# Altium integrated library Library 3D.IntLib: 259 symbols
Pins are listed as number, name and electrical type; pins without a type are passive.

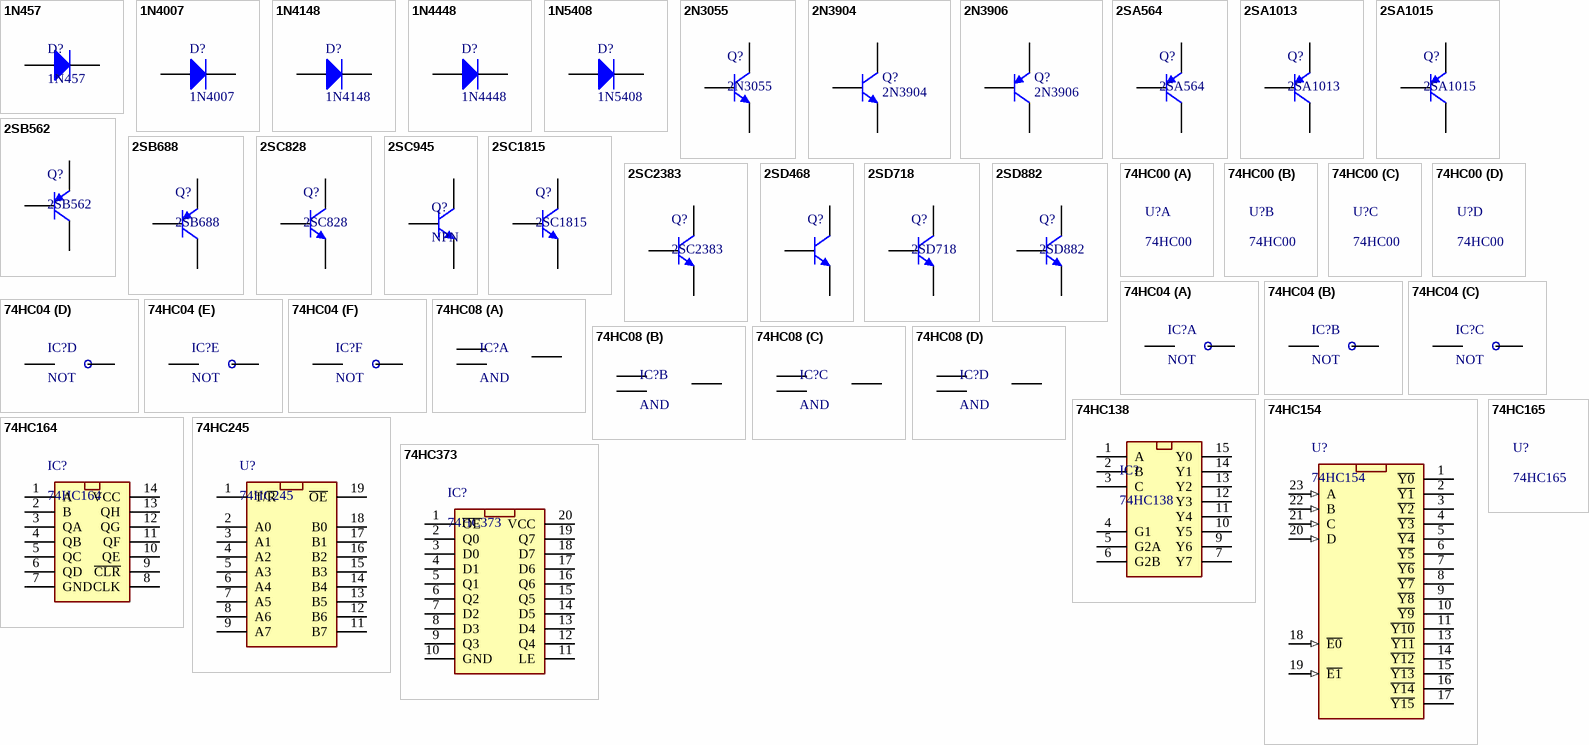
[diagram p0: symbols 1N457 to 74HC373]

## 1N457
designator D?
footprint DO 35
pins: 1 A, 2 K

## 1N4007
designator D?
Published: 8-Jun-2000; LatestRevisionDate: 17-Jul-2002; LatestRevisionNote: Re-released for DXP Platform.; DatasheetVersion: 1998; PackageVersion: Aug-1999; PackageReference: DO-41; Publisher: Altium Limited; PackageDescription: Diode, Axial; Body 5.2 x 2.7 mm (LxDia. max), Lead Dia. 0.86 mm (max); Code_JEDEC: DO-204-AL; ComponentLink1Description: Manufacturer Link; ComponentLink1URL: http://www.fairchildsemi.com/; ComponentLink2Description: Datasheet; ComponentLink2URL: http://www.fairchildsemi.com/ds/1N%2F1N4001.pdf
footprint 1N4007
footprint 1N4003
footprint SOD-123
pins: 1 A, 2 K

## 1N4148
designator D?
Published: 8-Jun-2000; LatestRevisionDate: 17-Jul-2002; LatestRevisionNote: Re-released for DXP Platform.; DatasheetVersion: 1997; PackageReference: DO-35; Publisher: Altium Limited; PackageDescription: Diode, Axial; Body 3.8 x 1.9 mm (LxDia. max), Lead Dia. 0.53 mm (max); Code_JEDEC: DO-204-AH; ComponentLink1Description: Manufacturer Link; ComponentLink1URL: http://www.fairchildsemi.com/; ComponentLink2Description: Datasheet; ComponentLink2URL: http://www.fairchildsemi.com/ds/1N%2F1N4148.pdf
footprint 1N4148
footprint SOD123
footprint SOD-123
footprint SOD80
pins: 1 A, 2 K

## 1N4448
designator D?
Published: 8-Jun-2000; LatestRevisionDate: 17-Jul-2002; LatestRevisionNote: Re-released for DXP Platform.; DatasheetVersion: 1997; PackageReference: DO-35; Publisher: Altium Limited; PackageDescription: Diode, Axial; Body 3.8 x 1.9 mm (LxDia. max), Lead Dia. 0.53 mm (max); Code_JEDEC: DO-204-AH; ComponentLink1Description: Manufacturer Link; ComponentLink1URL: http://www.fairchildsemi.com/; ComponentLink2Description: Datasheet; ComponentLink2URL: http://www.fairchildsemi.com/ds/1N%2F1N4448.pdf
footprint DO 35
pins: 1 A, 2 K

## 1N5408
designator D?
Published: 8-Jun-2000; LatestRevisionDate: 17-Jul-2002; LatestRevisionNote: Re-released for DXP Platform.; DatasheetVersion: Aug-1984; PackageReference: DO-201AD; Publisher: Altium Limited; PackageDescription: Diode, Axial; Body 9.5 x 5.3 mm (LxDia. max), Lead Dia. 1.32 mm (max); ComponentLink1Description: Manufacturer Link; ComponentLink1URL: http://www.irf.com/
footprint 1N5408
pins: 1 A, 2 K

## 2N3055
designator Q?
footprint TO03
pins: 1 E, 2 B, 3 C

## 2N3904
designator Q?
Published: 8-Jun-2000; LatestRevisionDate: 15-Jan-2003; LatestRevisionNote: PCB Footprint 'BCY-W3/D4.7' replaced; DatasheetVersion: 1997; PackageVersion: Sep-1998; PackageReference: TO-92A; Publisher: Altium Limited; PackageDescription: TO, Flat Index; 3 In-Line, Axial Leads; Body Dia. 4.5mm; Leads 0.51 x 0.48 mm (max); ComponentLink1Description: Manufacturer Link; ComponentLink1URL: http://www.fairchildsemi.com/; ComponentLink2Description: Datasheet; ComponentLink2URL: http://www.fairchildsemi.com/ds/2N%2F2N3904.pdf
footprint TO92A
pins: 1 E, 2 B, 3 C

## 2N3906
designator Q?
Published: 8-Jun-2000; LatestRevisionDate: 15-Jan-2003; LatestRevisionNote: PCB Footprint 'BCY-W3/D4.7' replaced; DatasheetVersion: 1997; PackageVersion: Sep-1998; PackageReference: TO-92A; Publisher: Altium Limited; PackageDescription: TO, Flat Index; 3 In-Line, Axial Leads; Body Dia. 4.5mm; Leads 0.51 x 0.48 mm (max); ComponentLink1Description: Manufacturer Link; ComponentLink1URL: http://www.fairchildsemi.com/; ComponentLink2Description: Datasheet; ComponentLink2URL: http://www.fairchildsemi.com/ds/2N%2F2N3906.pdf
footprint TO92A
pins: 1 E, 2 B, 3 C

## 2SA564
designator Q?
footprint TO92A
pins: 1 E, 2 C, 3 B

## 2SA1013
designator Q?
footprint TO226A
footprint SOT23-3
pins: 1 E, 2 C, 3 B

## 2SA1015
designator Q?
footprint TO92A
pins: 1 E, 2 C, 3 B

## 2SB562
designator Q?
footprint TO226A
pins: 1 E, 2 C, 3 B

## 2SB688
designator Q?
footprint TO3P
pins: 1 B, 2 C, 3 E

## 2SC828
designator Q?
footprint TO92A
pins: 1 E, 2 C, 3 B

## 2SC945
designator Q?, comment NPN
footprint TO92A
pins: 1 E, 2 C, 3 B

## 2SC1815
designator Q?
footprint TO92A
pins: 1 E, 2 C, 3 B

## 2SC2383
designator Q?
footprint TO226A
pins: 1 E, 2 C, 3 B

## 2SD468
designator Q?
footprint TO226A
pins: 1 E, 2 C, 3 B

## 2SD718
designator Q?
footprint TO3P
pins: 1 B, 2 C, 3 E

## 2SD882
designator Q?
footprint TO126
pins: 1 E, 2 C, 3 B

## 74HC00
designator U?

## 74HC04
designator IC?, comment NOT
footprint DIP14
footprint SSOP 14
footprint TSSOP 14
part A pins: 1, 2, 7 GND hidden to GND, 14 VCC hidden to VCC
part B pins: 3, 4
part C pins: 5, 6
part D pins: 8, 9
part E pins: 10, 11
part F pins: 12, 13

## 74HC08
designator IC?, comment AND
footprint DIP14
footprint SOIC 14
footprint TSSOP 14
part A pins: 1, 2, 3, 7 GND hidden to GND, 14 VCC hidden to VCC
part B pins: 4, 5, 6
part C pins: 8, 9, 10
part D pins: 11, 12, 13

## 74HC138
designator IC?
footprint DIP16
footprint SOIC 16
pins: 1 A, 2 B, 3 C, 4 G1, 5 G2A, 6 G2B, 7 Y7, 8 GND (power) hidden to GND, 9 Y6, 10 Y5, 11 Y4, 12 Y3, 13 Y2, 14 Y1, 15 Y0, 16 VCC hidden to VCC

## 74HC154
designator U?
footprint DIP24_600
footprint SSOP 24
pins: 1 ~{Y0}, 2 ~{Y1}, 3 ~{Y2}, 4 ~{Y3}, 5 ~{Y4}, 6 ~{Y5}, 7 ~{Y6}, 8 ~{Y7}, 9 ~{Y8}, 10 ~{Y9}, 11 ~{Y10}, 12 GND (power) hidden to GND, 13 ~{Y11}, 14 ~{Y12}, 15 ~{Y13}, 16 ~{Y14}, 17 ~{Y15}, 18 ~{E0} (in), 19 ~{E1} (in), 20 D (in), 21 C (in), 22 B (in), 23 A (in), 24 VCC (power) hidden to VCC

## 74HC164
designator IC?
footprint DIP14
footprint SOIC 14
pins: 1 A, 2 B, 3 QA, 4 QB, 5 QC, 6 QD, 7 GND, 8 CLK, 9 ~{CLR}, 10 QE, 11 QF, 12 QG, 13 QH, 14 VCC

## 74HC165
designator U?

## 74HC245
designator U?
footprint DIP20
footprint SO20
pins: 1 T/~{R}, 2 A0, 3 A1, 4 A2, 5 A3, 6 A4, 7 A5, 8 A6, 9 A7, 11 B7, 12 B6, 13 B5, 14 B4, 15 B3, 16 B2, 17 B1, 18 B0, 19 ~{OE}

## 74HC373
designator IC?
footprint DIP20
footprint SO20
pins: 1 ~{OE}, 2 Q0, 3 D0, 4 D1, 5 Q1, 6 Q2, 7 D2, 8 D3, 9 Q3, 10 GND, 11 LE, 12 Q4, 13 D4, 14 D5, 15 Q5, 16 Q6, 17 D6, 18 D7, 19 Q7, 20 VCC

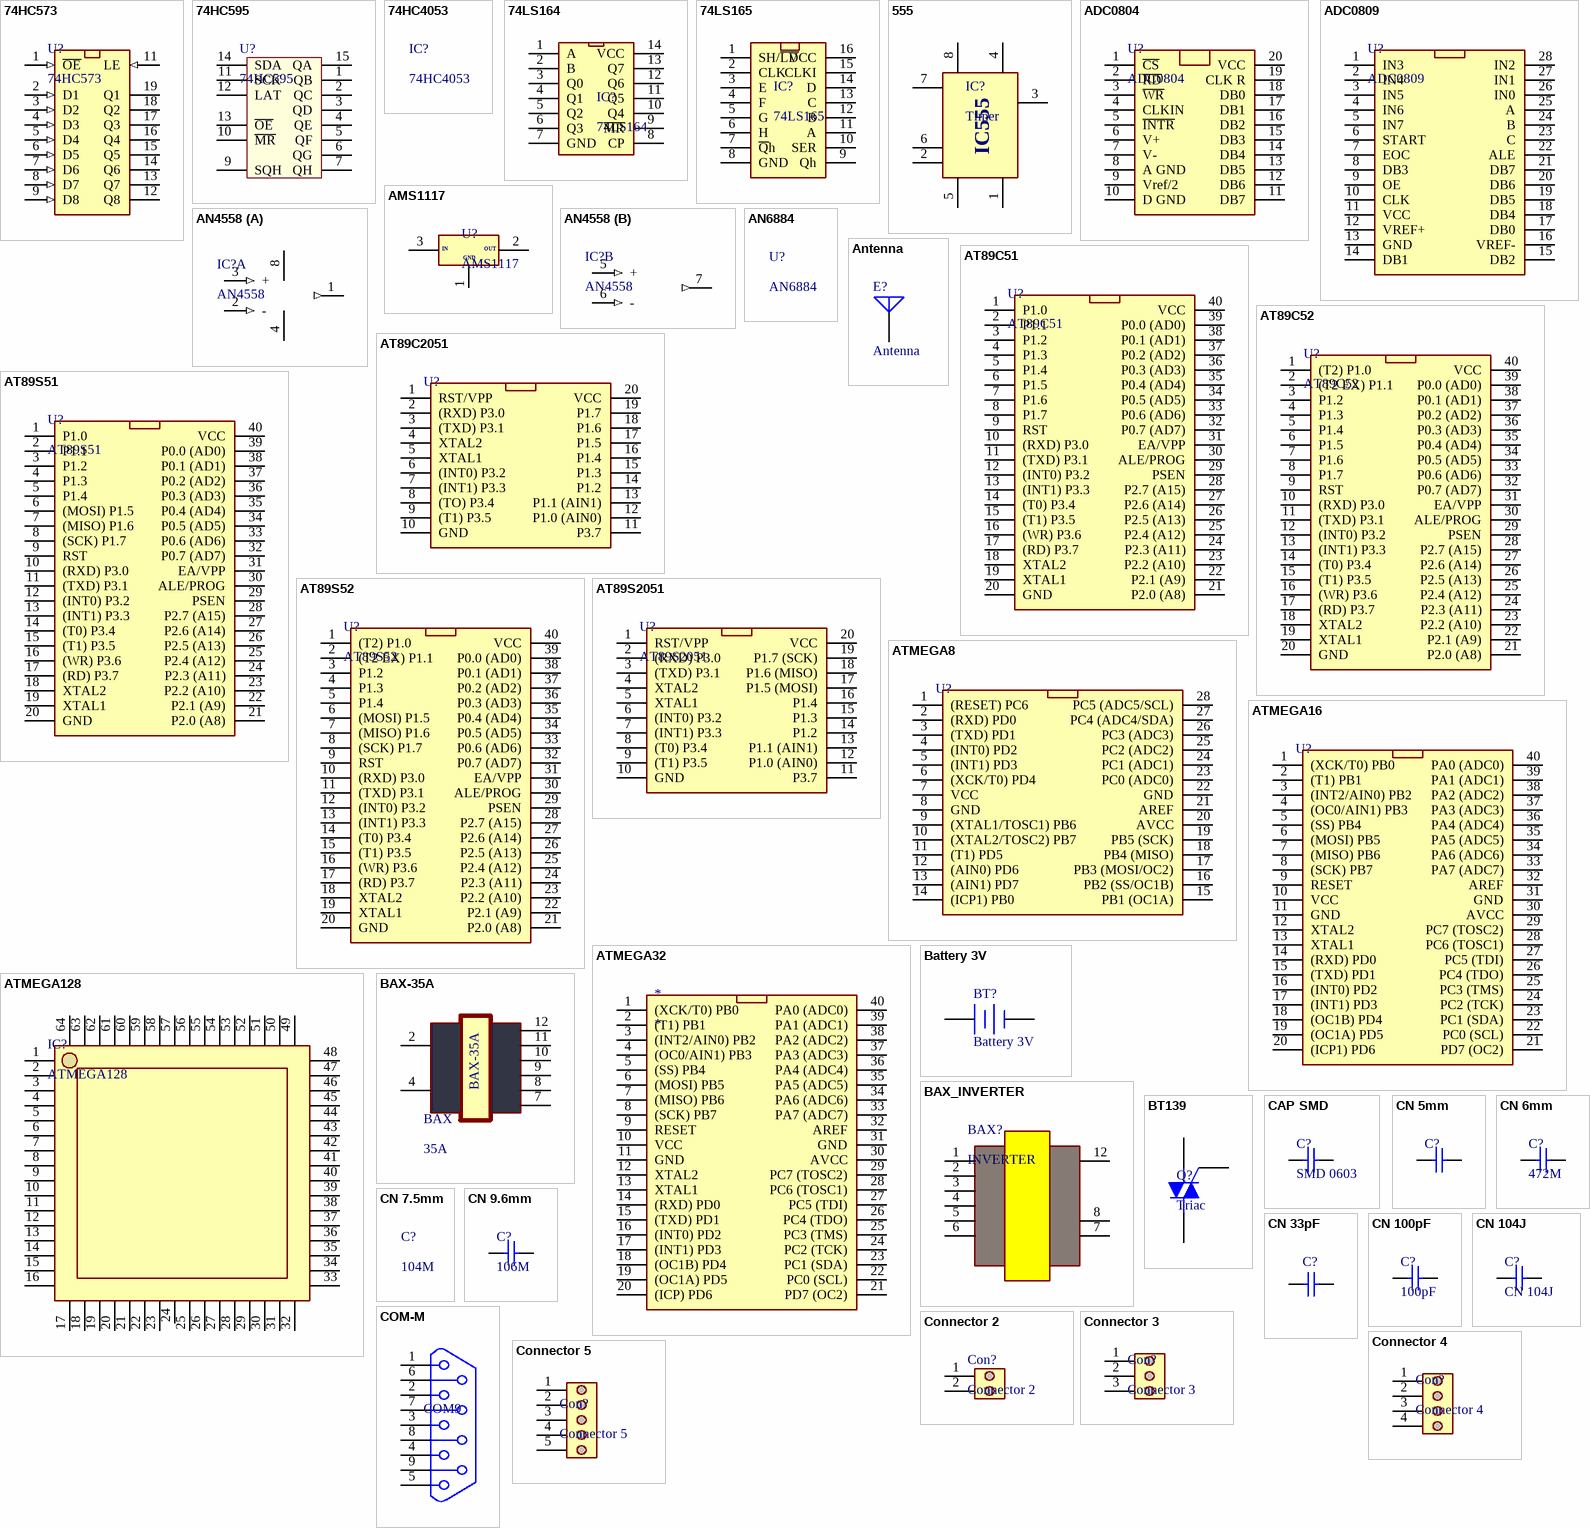
[diagram p1: symbols 74HC573 to Connector 5]

## 74HC573
designator U?
footprint DIP20
footprint SO20
pins: 1 ~{OE} (in), 2 D1 (in), 3 D2 (in), 4 D3 (in), 5 D4 (in), 6 D5 (in), 7 D6 (in), 8 D7 (in), 9 D8 (in), 11 LE (in), 12 Q8 (hiz), 13 Q7 (hiz), 14 Q6 (hiz), 15 Q5 (hiz), 16 Q4 (hiz), 17 Q3 (hiz), 18 Q2 (hiz), 19 Q1 (hiz)

## 74HC595
designator U?
footprint DIP16
footprint SO16
pins: 1 QB, 2 QC, 3 QD, 4 QE, 5 QF, 6 QG, 7 QH, 8 (power) hidden to GND, 9 SQH "OUTPUT", 10 ~{MR} "OUTPUT", 11 SCK "OUTPUT", 12 LAT "OUTPUT", 13 ~{OE} "OUTPUT", 14 SDA "OUTPUT", 15 QA, 16 (power) hidden to VCC

## 74HC4053
designator IC?

## 74LS164
designator IC?
footprint DIP14
footprint SOIC 14
pins: 1 A, 2 B, 3 Q0, 4 Q1, 5 Q2, 6 Q3, 7 GND, 8 CP, 9 ~{MR}, 10 Q4, 11 Q5, 12 Q6, 13 Q7, 14 VCC

## 74LS165
designator IC?
footprint DIP16
footprint SOIC 16
pins: 1 SH/~{LD}, 2 CLK, 3 E, 4 F, 5 G, 6 H, 7 ~{Q}h, 8 GND, 9 Qh, 10 SER, 11 A, 12 B, 13 C, 14 D, 15 CLKI, 16 VCC

## 555
designator IC?, comment Timer
footprint DIP8
pins: 1, 2, 3, 4, 5, 6, 7, 8
text: IC555

## ADC0804
designator U?
footprint DIP20
pins: 1 ~{CS}, 2 ~{RD}, 3 ~{WR}, 4 CLKIN, 5 ~{INTR}, 6 V+, 7 V-, 8 A GND, 9 Vref/2, 10 D GND, 11 DB7, 12 DB6, 13 DB5, 14 DB4, 15 DB3, 16 DB2, 17 DB1, 18 DB0, 19 CLK R, 20 VCC

## ADC0809
designator U?
footprint DIP28_600
pins: 1 IN3, 2 IN4, 3 IN5, 4 IN6, 5 IN7, 6 START, 7 EOC, 8 DB3, 9 OE, 10 CLK, 11 VCC, 12 VREF+, 13 GND, 14 DB1, 15 DB2, 16 VREF-, 17 DB0, 18 DB4, 19 DB5, 20 DB6, 21 DB7, 22 ALE, 23 C, 24 B, 25 A, 26 IN0, 27 IN1, 28 IN2

## AMS1117
designator U?
footprint TO252-3
footprint SOIC 8
footprint SOT223_L
pins: 1 GND, 2 OUT, 3 GND
text: IN

## AN4558
designator IC?
footprint DIP8
part A pins: 1 (out), 2 - (in), 3 + (in), 4 GND, 8 VCC
part B pins: 5 + (in), 6 - (in), 7 1 (out)

## AN6884
designator U?

## Antenna
designator E?
Published: 24-Mar-1999; LatestRevisionDate: 17-Jul-2002; LatestRevisionNote: Re-released for DXP Platform.; PackageReference: PIN1; Publisher: Altium Limited
pins: 1 A

## AT89C51
designator U?
footprint DIP40
pins: 1 P1.0, 2 P1.1, 3 P1.2, 4 P1.3, 5 P1.4, 6 P1.5, 7 P1.6, 8 P1.7, 9 RST, 10 (RXD) P3.0, 11 (TXD) P3.1, 12 (INT0) P3.2, 13 (INT1) P3.3, 14 (T0) P3.4, 15 (T1) P3.5, 16 (WR) P3.6, 17 (RD) P3.7, 18 XTAL2, 19 XTAL1, 20 GND, 21 P2.0 (A8), 22 P2.1 (A9), 23 P2.2 (A10), 24 P2.3 (A11), 25 P2.4 (A12), 26 P2.5 (A13), 27 P2.6 (A14), 28 P2.7 (A15), 29 PSEN, 30 ALE/PROG, 31 EA/VPP, 32 P0.7 (AD7), 33 P0.6 (AD6), 34 P0.5 (AD5), 35 P0.4 (AD4), 36 P0.3 (AD3), 37 P0.2 (AD2), 38 P0.1 (AD1), 39 P0.0 (AD0), 40 VCC

## AT89C52
designator U?
footprint DIP40
pins: 1 (T2) P1.0, 2 (T2 EX) P1.1, 3 P1.2, 4 P1.3, 5 P1.4, 6 P1.5, 7 P1.6, 8 P1.7, 9 RST, 10 (RXD) P3.0, 11 (TXD) P3.1, 12 (INT0) P3.2, 13 (INT1) P3.3, 14 (T0) P3.4, 15 (T1) P3.5, 16 (WR) P3.6, 17 (RD) P3.7, 18 XTAL2, 19 XTAL1, 20 GND, 21 P2.0 (A8), 22 P2.1 (A9), 23 P2.2 (A10), 24 P2.3 (A11), 25 P2.4 (A12), 26 P2.5 (A13), 27 P2.6 (A14), 28 P2.7 (A15), 29 PSEN, 30 ALE/PROG, 31 EA/VPP, 32 P0.7 (AD7), 33 P0.6 (AD6), 34 P0.5 (AD5), 35 P0.4 (AD4), 36 P0.3 (AD3), 37 P0.2 (AD2), 38 P0.1 (AD1), 39 P0.0 (AD0), 40 VCC

## AT89C2051
designator U?
footprint DIP20
pins: 1 RST/VPP, 2 (RXD) P3.0, 3 (TXD) P3.1, 4 XTAL2, 5 XTAL1, 6 (INT0) P3.2, 7 (INT1) P3.3, 8 (TO) P3.4, 9 (T1) P3.5, 10 GND, 11 P3.7, 12 P1.0 (AIN0), 13 P1.1 (AIN1), 14 P1.2, 15 P1.3, 16 P1.4, 17 P1.5, 18 P1.6, 19 P1.7, 20 VCC

## AT89S51
designator U?
footprint DIP40
pins: 1 P1.0, 2 P1.1, 3 P1.2, 4 P1.3, 5 P1.4, 6 (MOSI) P1.5, 7 (MISO) P1.6, 8 (SCK) P1.7, 9 RST, 10 (RXD) P3.0, 11 (TXD) P3.1, 12 (INT0) P3.2, 13 (INT1) P3.3, 14 (T0) P3.4, 15 (T1) P3.5, 16 (WR) P3.6, 17 (RD) P3.7, 18 XTAL2, 19 XTAL1, 20 GND, 21 P2.0 (A8), 22 P2.1 (A9), 23 P2.2 (A10), 24 P2.3 (A11), 25 P2.4 (A12), 26 P2.5 (A13), 27 P2.6 (A14), 28 P2.7 (A15), 29 PSEN, 30 ALE/PROG, 31 EA/VPP, 32 P0.7 (AD7), 33 P0.6 (AD6), 34 P0.5 (AD5), 35 P0.4 (AD4), 36 P0.3 (AD3), 37 P0.2 (AD2), 38 P0.1 (AD1), 39 P0.0 (AD0), 40 VCC

## AT89S52
designator U?
footprint DIP40
pins: 1 (T2) P1.0, 2 (T2 EX) P1.1, 3 P1.2, 4 P1.3, 5 P1.4, 6 (MOSI) P1.5, 7 (MISO) P1.6, 8 (SCK) P1.7, 9 RST, 10 (RXD) P3.0, 11 (TXD) P3.1, 12 (INT0) P3.2, 13 (INT1) P3.3, 14 (T0) P3.4, 15 (T1) P3.5, 16 (WR) P3.6, 17 (RD) P3.7, 18 XTAL2, 19 XTAL1, 20 GND, 21 P2.0 (A8), 22 P2.1 (A9), 23 P2.2 (A10), 24 P2.3 (A11), 25 P2.4 (A12), 26 P2.5 (A13), 27 P2.6 (A14), 28 P2.7 (A15), 29 PSEN, 30 ALE/PROG, 31 EA/VPP, 32 P0.7 (AD7), 33 P0.6 (AD6), 34 P0.5 (AD5), 35 P0.4 (AD4), 36 P0.3 (AD3), 37 P0.2 (AD2), 38 P0.1 (AD1), 39 P0.0 (AD0), 40 VCC

## AT89S2051
designator U?
footprint DIP20
pins: 1 RST/VPP, 2 (RXD) P3.0, 3 (TXD) P3.1, 4 XTAL2, 5 XTAL1, 6 (INT0) P3.2, 7 (INT1) P3.3, 8 (T0) P3.4, 9 (T1) P3.5, 10 GND, 11 P3.7, 12 P1.0 (AIN0), 13 P1.1 (AIN1), 14 P1.2, 15 P1.3, 16 P1.4, 17 P1.5 (MOSI), 18 P1.6 (MISO), 19 P1.7 (SCK), 20 VCC

## ATMEGA8
designator U?
footprint DIP28
footprint TQFP32
pins: 1 (RESET) PC6, 2 (RXD) PD0, 3 (TXD) PD1, 4 (INT0) PD2, 5 (INT1) PD3, 6 (XCK/T0) PD4, 7 VCC, 8 GND, 9 (XTAL1/TOSC1) PB6, 10 (XTAL2/TOSC2) PB7, 11 (T1) PD5, 12 (AIN0) PD6, 13 (AIN1) PD7, 14 (ICP1) PB0, 15 PB1 (OC1A), 16 PB2 (SS/OC1B), 17 PB3 (MOSI/OC2), 18 PB4 (MISO), 19 PB5 (SCK), 20 AVCC, 21 AREF, 22 GND, 23 PC0 (ADC0), 24 PC1 (ADC1), 25 PC2 (ADC2), 26 PC3 (ADC3), 27 PC4 (ADC4/SDA), 28 PC5 (ADC5/SCL)

## ATMEGA16
designator U?
footprint DIP40
footprint TQFP44
pins: 1 (XCK/T0) PB0, 2 (T1) PB1, 3 (INT2/AIN0) PB2, 4 (OC0/AIN1) PB3, 5 (SS) PB4, 6 (MOSI) PB5, 7 (MISO) PB6, 8 (SCK) PB7, 9 RESET, 10 VCC, 11 GND, 12 XTAL2, 13 XTAL1, 14 (RXD) PD0, 15 (TXD) PD1, 16 (INT0) PD2, 17 (INT1) PD3, 18 (OC1B) PD4, 19 (OC1A) PD5, 20 (ICP1) PD6, 21 PD7 (OC2), 22 PC0 (SCL), 23 PC1 (SDA), 24 PC2 (TCK), 25 PC3 (TMS), 26 PC4 (TDO), 27 PC5 (TDI), 28 PC6 (TOSC1), 29 PC7 (TOSC2), 30 AVCC, 31 GND, 32 AREF, 33 PA7 (ADC7), 34 PA6 (ADC6), 35 PA5 (ADC5), 36 PA4 (ADC4), 37 PA3 (ADC3), 38 PA2 (ADC2), 39 PA1 (ADC1), 40 PA0 (ADC0)

## ATMEGA32
designator *
footprint DIP40
footprint TQFP44
pins: 1 (XCK/T0) PB0, 2 (T1) PB1, 3 (INT2/AIN0) PB2, 4 (OC0/AIN1) PB3, 5 (SS) PB4, 6 (MOSI) PB5, 7 (MISO) PB6, 8 (SCK) PB7, 9 RESET, 10 VCC, 11 GND, 12 XTAL2, 13 XTAL1, 14 (RXD) PD0, 15 (TXD) PD1, 16 (INT0) PD2, 17 (INT1) PD3, 18 (OC1B) PD4, 19 (OC1A) PD5, 20 (ICP) PD6, 21 PD7 (OC2), 22 PC0 (SCL), 23 PC1 (SDA), 24 PC2 (TCK), 25 PC3 (TMS), 26 PC4 (TDO), 27 PC5 (TDI), 28 PC6 (TOSC1), 29 PC7 (TOSC2), 30 AVCC, 31 GND, 32 AREF, 33 PA7 (ADC7), 34 PA6 (ADC6), 35 PA5 (ADC5), 36 PA4 (ADC4), 37 PA3 (ADC3), 38 PA2 (ADC2), 39 PA1 (ADC1), 40 PA0 (ADC0)

## ATMEGA128
designator IC?
footprint TQFP64
pins: 1, 2, 3, 4, 5, 6, 7, 8, 9, 10, 11, 12, 13, 14, 15, 16, 17, 18, 19, 20, 21, 22, 23, 24, 25, 26, 27, 28, 29, 30, 31, 32, 33, 34, 35, 36, 37, 38, 39, 40, 41, 42, 43, 44, 45, 46, 47, 48, 49, 50, 51, 52, 53, 54, 55, 56, 57, 58, 59, 60, 61, 62, 63, 64

## Battery 3V
designator BT?
Published: 24-Mar-1999; LatestRevisionDate: 17-Jul-2002; LatestRevisionNote: Re-released for DXP Platform.; PackageReference: BAT-2; Publisher: Altium Limited; PackageDescription: Battery; 2 Leads
footprint PIN_3V
pins: 1 +, 2 -

## BAX-35A
designator BAX, comment 35A
footprint BAX-35A
pins: 2, 4, 7, 8, 9, 10, 11, 12

## BAX_INVERTER
designator BAX?, comment INVERTER
footprint BAX_INVERTER
pins: 1, 2, 3, 4, 5, 6, 7, 8, 12

## BT139
designator Q?, comment Triac
footprint TO220AB
pins: 1 T1, 2 T2, 3 G

## CAP SMD
designator C?, comment SMD 0603
footprint CAP SMD 0603
footprint SMD CAPACITOR0201
footprint SMD CAPACITOR0402
footprint SMD CAPACITOR0603
footprint SMD CAPACITOR0805
footprint SMD CAPACITOR1206
footprint SMD CAPACITOR1808
footprint SMD CAPACITOR1812
footprint SMD CAPACITOR0603
pins: 1, 2

## CN 5mm
designator C?
footprint CN1
pins: 1, 2

## CN 6mm
designator C?, comment 472M
footprint CN 472/3KV
pins: 1, 2

## CN 7.5mm
designator C?, comment 104M
footprint CN2

## CN 9.6mm
designator C?, comment 106M
footprint CN3
pins: 1, 2

## CN 33pF
designator C?
Published: 8-Jun-2000; LatestRevisionDate: 17-Jul-2002; LatestRevisionNote: Re-released for DXP Platform.; PackageReference: RAD-0.3; Publisher: Altium Limited; PackageDescription: Radial Cap, Thru-Hole; 2 Leads; 0.3 in Pin Spacing
footprint CN5
footprint SMD CAPACITOR1206
pins: 1, 2

## CN 100pF
designator C?, comment 100pF
footprint CN4
footprint SMD CAPACITOR1206
pins: 1, 2

## CN 104J
designator C?
footprint CN4 104J
pins: 1, 2

## COM-M
designator COM9
footprint COM 9M
footprint COM 9F
pins: 1, 2, 3, 4, 5, 6, 7, 8, 9

## Connector 2
designator Con?
footprint CON 2
pins: 1, 2

## Connector 3
designator Con?
footprint CON 3
pins: 1, 2, 3

## Connector 4
designator Con?
footprint CON 4
pins: 1, 2, 3, 4

## Connector 5
designator Con?
footprint CON 5
pins: 1, 2, 3, 4, 5

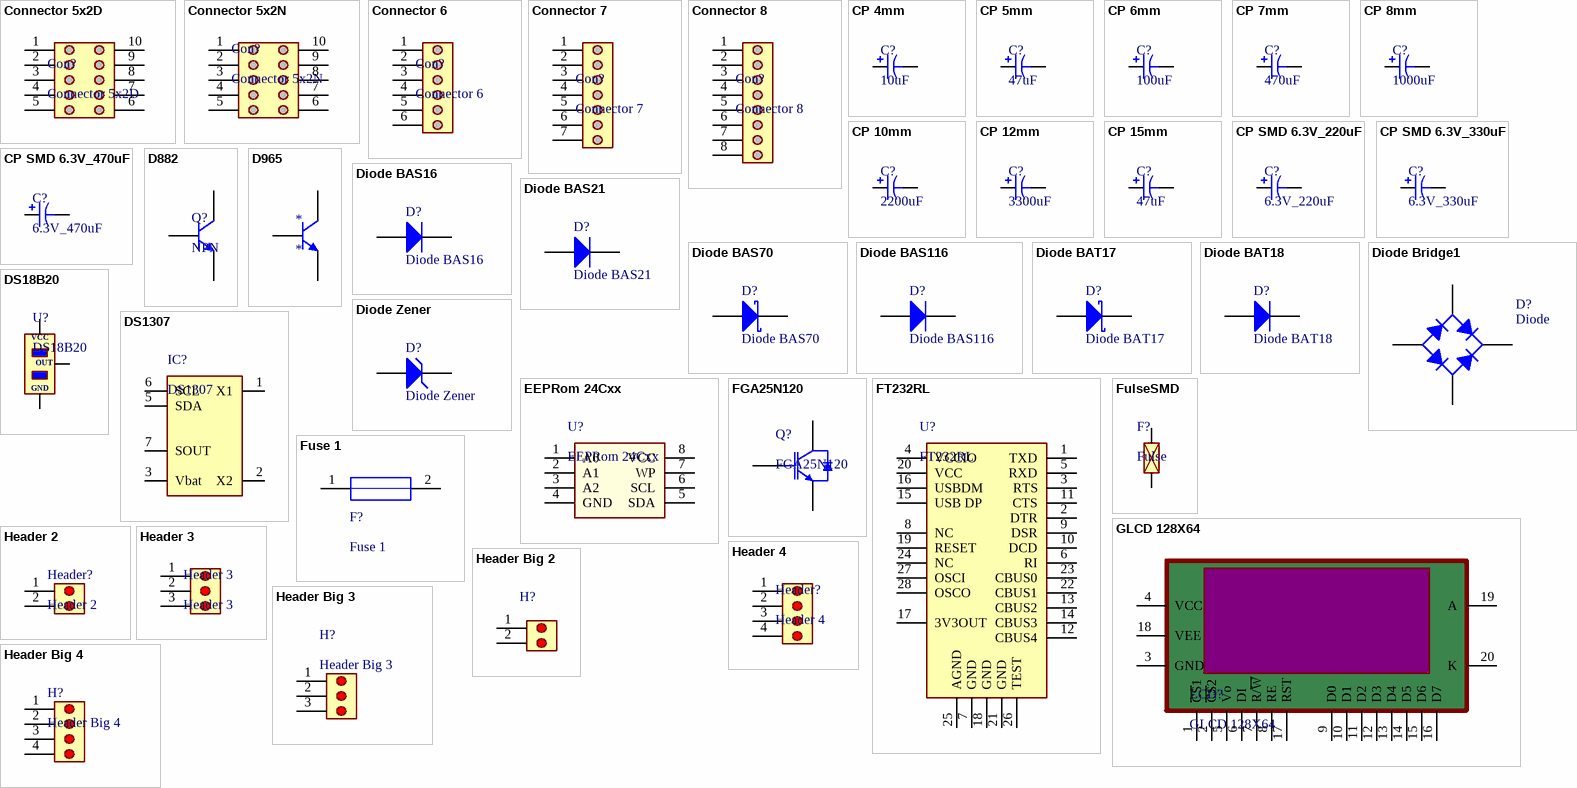
[diagram p2: symbols Connector 5x2D to Header Big 4]

## Connector 5x2D
designator Con?
footprint CONNECTOR_5X2_T
pins: 1, 2, 3, 4, 5, 6, 7, 8, 9, 10

## Connector 5x2N
designator Con?
footprint CONNECTOR_5X2_N
pins: 1, 2, 3, 4, 5, 6, 7, 8, 9, 10

## Connector 6
designator Con?
footprint CON 6
pins: 1, 2, 3, 4, 5, 6

## Connector 7
designator Con?
footprint CON 7
pins: 1, 2, 3, 4, 5, 6, 7

## Connector 8
designator Con?
footprint CON 8
pins: 1, 2, 3, 4, 5, 6, 7, 8

## CP 4mm
designator C?, comment 10uF
footprint CP 4mm
footprint CAP SMD SVP 4.0x5.4
footprint CAP SMD SVP 5.0x5.9
pins: 1, 2

## CP 5mm
designator C?, comment 47uF
footprint CP 5mm
pins: 1, 2

## CP 6mm
designator C?, comment 100uF
footprint CP 6mm
pins: 1, 2

## CP 7mm
designator C?, comment 470uF
footprint CP 7mm
pins: 1, 2

## CP 8mm
designator C?, comment 1000uF
footprint CP 8mm
pins: 1, 2

## CP 10mm
designator C?, comment 2200uF
footprint CP 10mm
pins: 1, 2

## CP 12mm
designator C?, comment 3300uF
footprint CP 12mm
pins: 1, 2

## CP 15mm
designator C?, comment 47uF
footprint CP 22mm
pins: 1, 2

## CP SMD 6.3V_220uF
designator C?, comment 6.3V_220uF
footprint Capacitors 220uF 6,3V
pins: 1, 2

## CP SMD 6.3V_330uF
designator C?, comment 6.3V_330uF
footprint Capacitors 330uF 6,3V
pins: 1, 2

## CP SMD 6.3V_470uF
designator C?, comment 6.3V_470uF
footprint Capacitors 470uF 6,3V
pins: 1, 2

## D882
designator Q?, comment NPN
footprint TO126
pins: 1 E, 2 C, 3 B

## D965
designator *
footprint TO92A
pins: 1 E, 2 C, 3 B

## Diode BAS16
designator D?
Note: Pin 2 is not connected and not drawn.; Published: 21-Mar-2003; LatestRevisionDate: 29-May-2009; LatestRevisionNote: IPC-7351 Footprint Added.; DatasheetVersion: Oct-1999; PackageVersion: Sep-2001; PackageReference: SOT-23; Publisher: Altium Limited; PackageDescription: 3-Pin SOT-23 Package 0.95 mm Pitch, 2.5 mm Lead Span; ComponentLink1Description: Manufacturer Link; ComponentLink1URL: http://www.infineon.com/; ComponentLink2Description: Datasheet; ComponentLink2URL: http://www.infineon.com/upload/Document/cmc_upload/documents/012/5331/bas16series.pdf
footprint SOT23-3
pins: 1 A, 3 K

## Diode BAS21
designator D?
Note: Pin 2 is not connected and not drawn.; Published: 21-Mar-2003; LatestRevisionDate: 29-May-2009; LatestRevisionNote: IPC-7351 Footprint Added.; DatasheetVersion: Oct-1999; PackageVersion: Sep-2001; PackageReference: SOT-23; Publisher: Altium Limited; PackageDescription: 3-Pin SOT-23 Package 0.95 mm Pitch, 2.5 mm Lead Span; ComponentLink1Description: Manufacturer Link; ComponentLink1URL: http://www.infineon.com/; ComponentLink2Description: Datasheet; ComponentLink2URL: http://www.infineon.com/upload/Document/cmc_upload/documents/080/812/bas21series.pdf
footprint SOT23-3
pins: 1 A, 3 K

## Diode BAS70
designator D?
Note: Pin 2 is not connected and not drawn.; Published: 21-Mar-2003; LatestRevisionDate: 29-May-2009; LatestRevisionNote: IPC-7351 Footprint Added.; DatasheetVersion: Oct-1999; PackageVersion: Sep-2001; PackageReference: SOT-23; Publisher: Altium Limited; PackageDescription: 3-Pin SOT-23 Package 0.95 mm Pitch, 2.5 mm Lead Span; ComponentLink1Description: Manufacturer Link; ComponentLink1URL: http://www.infineon.com/; ComponentLink2Description: Datasheet; ComponentLink2URL: http://www.infineon.com/upload/Document/cmc_upload/documents/009/382/bas40_bas140series_1.pdf
footprint SOT23-3
pins: 1 A, 3 K

## Diode BAS116
designator D?
Note: Pin 2 is not connected and not drawn.; Published: 21-Mar-2003; LatestRevisionDate: 29-May-2009; LatestRevisionNote: IPC-7351 Footprint Added.; DatasheetVersion: Oct-1999; PackageVersion: Sep-2001; PackageReference: SOT-23; Publisher: Altium Limited; PackageDescription: 3-Pin SOT-23 Package 0.95 mm Pitch, 2.5 mm Lead Span; ComponentLink1Description: Manufacturer Link; ComponentLink1URL: http://www.infineon.com/; ComponentLink2Description: Datasheet; ComponentLink2URL: http://www.infineon.com/upload/Document/cmc_upload/documents/080/656/bas116series.pdf
footprint SOT23-3
pins: 1 A, 3 K

## Diode BAT17
designator D?
Note: Pin 2 is not connected and not drawn.; Published: 21-Mar-2003; LatestRevisionDate: 29-May-2009; LatestRevisionNote: IPC-7351 Footprint Added.; DatasheetVersion: Oct-1999; PackageVersion: Sep-2001; PackageReference: SOT-23; Publisher: Altium Limited; PackageDescription: 3-Pin SOT-23 Package 0.95 mm Pitch, 2.5 mm Lead Span; ComponentLink1Description: Manufacturer Link; ComponentLink1URL: http://www.infineon.com/; ComponentLink2Description: Datasheet; ComponentLink2URL: http://www.infineon.com/upload/Document/cmc_upload/documents/009/363/bat17series.pdf
footprint SOT23-3
pins: 1 A, 3 K

## Diode BAT18
designator D?
Note: Pin 2 is not connected and not drawn.; Published: 21-Mar-2003; LatestRevisionDate: 29-May-2009; LatestRevisionNote: IPC-7351 Footprint Added.; DatasheetVersion: Oct-1999; PackageVersion: Sep-2001; PackageReference: SOT-23; Publisher: Altium Limited; PackageDescription: 3-Pin SOT-23 Package 0.95 mm Pitch, 2.5 mm Lead Span; ComponentLink1Description: Manufacturer Link; ComponentLink1URL: http://www.infineon.com/
footprint SOT23-3
pins: 1 A, 3 K

## Diode Bridge1
designator D?, comment Diode
Published: 8-Jun-2000; LatestRevisionDate: 29-May-2009; LatestRevisionNote: Sch pins A & K swapped.; DatasheetVersion: E2732B; PackageReference: D-38; Publisher: Altium Limited; PackageDescription: Bridge Rectifier; 4 Terminals; Body 9.4 x 9.4 mm (typ); Pitch 5.08 mm
footprint DIODE_bridge_2a
footprint DIODE_BRIDGE_10A
pins: 1, 2, 3, 4

## Diode Zener
designator D?
Published: 8-Jun-2000; LatestRevisionDate: 17-Jul-2002; LatestRevisionNote: Re-released for DXP Platform.; PackageReference: DIODE-0.7; Publisher: Altium Limited; PackageDescription: Diode, Thru-Hole; 2 Leads; 0.7 in Pin Spacing
footprint Diode Zener
pins: 1 A, 2 K

## DS18B20
designator U?
footprint TO92A
pins: 1 GND, 2 OUT, 3 VCC

## DS1307
designator IC?
footprint SOIC 8
footprint DIP8
pins: 1 X1, 2 X2, 3 Vbat, 4 GND hidden to GND, 5 SDA, 6 SCL, 7 SOUT, 8 VCC hidden to VCC

## EEPRom 24Cxx
designator U?
footprint DIP8
pins: 1 A0, 2 A1, 3 A2, 4 GND (power), 5 SDA, 6 SCL, 7 WP, 8 VCC (power)

## FGA25N120
designator Q?
footprint TO3P
pins: 1 G, 2 C, 3 E

## FT232RL
designator U?
footprint SSOP 28
pins: 1 TXD, 2 DTR, 3 RTS, 4 VCCIO, 5 RXD, 6 RI, 7 GND, 8 NC, 9 DSR, 10 DCD, 11 CTS, 12 CBUS4, 13 CBUS2, 14 CBUS3, 15 USB DP, 16 USBDM, 17 3V3OUT, 18 GND, 19 RESET, 20 VCC, 21 GND, 22 CBUS1, 23 CBUS0, 24 NC, 25 AGND, 26 TEST, 27 OSCI, 28 OSCO

## FulseSMD
designator F?, comment Fulse
footprint SMD 1206
pins: 1, 2

## Fuse 1
designator F?
Published: 8-Jun-2000; LatestRevisionDate: 17-Jul-2002; LatestRevisionNote: Re-released for DXP Platform.; PackageReference: PIN-W2/E2.8; Publisher: Altium Limited; PackageDescription: Thru-Hole; 2 Leads
footprint FUSE1
footprint FUSE2
pins: 1, 2

## GLCD 128X64
designator LCD?
footprint LCD_128X64
pins: 1 ~{CS}1, 2 ~{CS}2, 3 GND, 4 VCC, 5 Vo, 6 DI, 7 R/~{W}, 8 RE, 9 D0, 10 D1, 11 D2, 12 D3, 13 D4, 14 D5, 15 D6, 16 D7, 17 RST, 18 VEE, 19 A, 20 K

## Header 2
designator Header?
footprint HEADER 2A
footprint HEADER 2B
pins: 1, 2

## Header 3
designator Header 3
footprint HEADER 3
pins: 1, 2, 3

## Header 4
designator Header?
footprint HEADER 4
pins: 1, 2, 3, 4

## Header Big 2
designator H?
footprint HEADER BIG 2
pins: 1, 2

## Header Big 3
designator H?
footprint HEADER BIG 3
pins: 1, 2, 3

## Header Big 4
designator H?
footprint HEADER BIG 4
pins: 1, 2, 3, 4

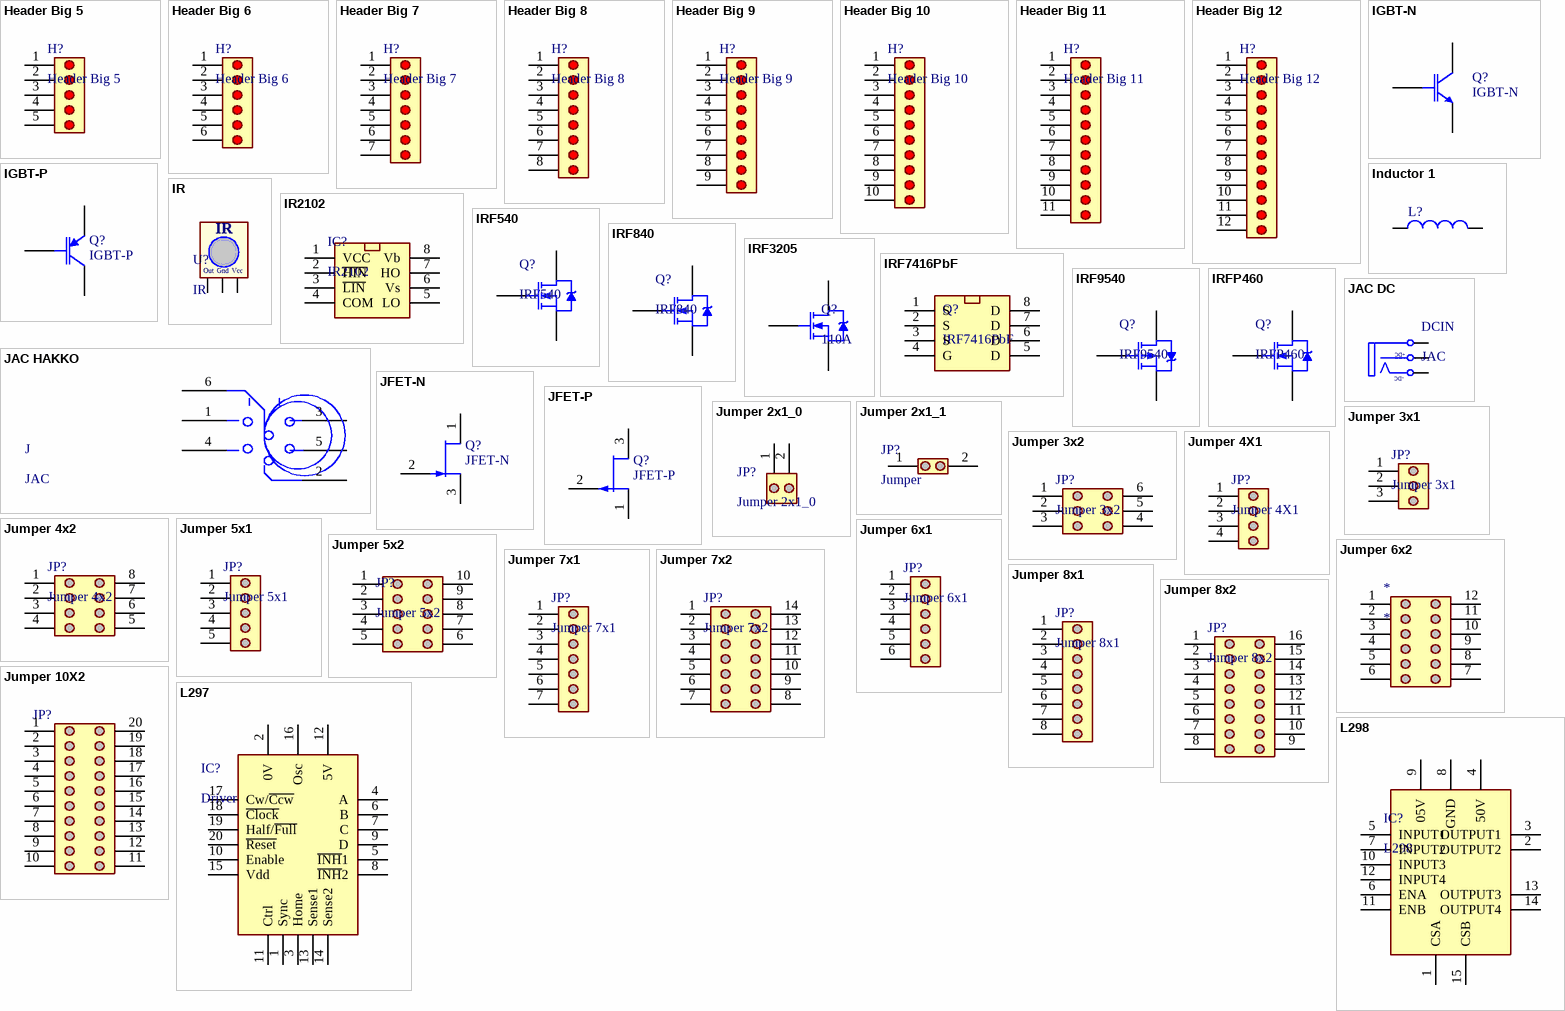
[diagram p3: symbols Header Big 5 to L298]

## Header Big 5
designator H?
footprint HEADER BIG 5
pins: 1, 2, 3, 4, 5

## Header Big 6
designator H?
footprint HEADER BIG 6
pins: 1, 2, 3, 4, 5, 6

## Header Big 7
designator H?
footprint HEADER BIG 7
pins: 1, 2, 3, 4, 5, 6, 7

## Header Big 8
designator H?
footprint HEADER BIG 8
pins: 1, 2, 3, 4, 5, 6, 7, 8

## Header Big 9
designator H?
footprint HEADER BIG 9
pins: 1, 2, 3, 4, 5, 6, 7, 8, 9

## Header Big 10
designator H?
footprint HEADER BIG 10
pins: 1, 2, 3, 4, 5, 6, 7, 8, 9, 10

## Header Big 11
designator H?
footprint HEADER BIG 11
pins: 1, 2, 3, 4, 5, 6, 7, 8, 9, 10, 11

## Header Big 12
designator H?
footprint HEADER BIG 12
pins: 1, 2, 3, 4, 5, 6, 7, 8, 9, 10, 11, 12

## IGBT-N
designator Q?
Published: 8-Jun-2000; LatestRevisionDate: 17-Jul-2002; LatestRevisionNote: Re-released for DXP Platform.; DatasheetVersion: PD-9.684A; PackageReference: TO-247; Publisher: Altium Limited; PackageDescription: SIP with Mounting Hole; 3 Leads; Body 20 x 15.6 x 5 mm (typ); Pitch 5.45 mm; Code_JEDEC: TO-247-AC; ComponentLink1Description: Manufacturer Link; ComponentLink1URL: http://www.irf.com/
footprint TO247
pins: 1 C, 2 G, 3 E

## IGBT-P
designator Q?
Published: 8-Jun-2000; LatestRevisionDate: 17-Jul-2002; LatestRevisionNote: Re-released for DXP Platform.; PackageReference: TO-264-AA; Publisher: Altium Limited; Code_JEDEC: TO-264-AA
footprint TO264
pins: 1 C, 2 G, 3 E

## Inductor 1
designator L?
Code_IEC: 1005; Published: 8-Jun-2000; LatestRevisionDate: 29-May-2009; LatestRevisionNote: IPC-7351 Footprint Added.; PackageReference: 0402-A; Publisher: Altium Limited; PackageDescription: Chip Inductor; Code_JEITA: 0402
footprint Inductor 10x12
pins: 1, 2

## IR
designator U?
footprint TSOP 1738
footprint TSOP 4838
pins: 1 Out, 2 GND, 3 VCC
text: Gnd; Vcc

## IR2102
designator IC?
footprint SOIC 8
footprint DIP8
pins: 1 VCC, 2 ~{HIN}, 3 ~{LIN}, 4 COM, 5 LO, 6 Vs, 7 HO, 8 Vb

## IRF540
designator Q?
footprint TO220A
footprint TO220AH1
pins: 1 G, 2 D, 3 S

## IRF840
designator Q?
footprint TO220A
pins: 1 G, 2 D, 3 S

## IRF3205
designator Q?, comment 110A
footprint TO220AB
pins: 1 G, 2 D, 3 S

## IRF7416PbF
designator Q?
footprint SOIC 8
pins: 1 S, 2 S, 3 S, 4 G, 5 D, 6 D, 7 D, 8 D

## IRF9540
designator Q?
footprint TO220A
pins: 1 G, 2 D, 3 S

## IRFP460
designator Q?
footprint TO247
pins: 1 G, 2 D, 3 S

## JAC DC
designator DCIN, comment JAC
footprint Jack DC
pins: 1 T "Tip", 2 S (power) "Sleeve (Ground)", 3 TN "Tip Normal (Break Contact)"
text: +DC; -DC

## JAC HAKKO
designator J, comment JAC
pins: 1, 2, 3, 4, 5, 6

## JFET-N
designator Q?
Published: 8-Jun-2000; LatestRevisionDate: 17-Jul-2002; LatestRevisionNote: Re-released for DXP Platform.; PackageReference: TO-254-AA; Publisher: Altium Limited; Code_JEDEC: TO-254-AA
footprint TO254
pins: 1 D, 2 G, 3 S

## JFET-P
designator Q?
Published: 8-Jun-2000; LatestRevisionDate: 17-Jul-2002; LatestRevisionNote: Re-released for DXP Platform.; PackageReference: TO-18A; Publisher: Altium Limited; PackageDescription: SC-89; 3 Flat Leads; Body 1.6 x 1.6 x 0.7 mm, inc leads (LxWxH typ)
footprint TO18
pins: 1 D, 2 G, 3 S

## Jumper 2x1_0
designator JP?
footprint JP2
pins: 1, 2

## Jumper 2x1_1
designator JP?, comment Jumper
footprint JP2
pins: 1, 2

## Jumper 3x1
designator JP?
footprint JP3
pins: 1, 2, 3

## Jumper 3x2
designator JP?
pins: 1, 2, 3, 4, 5, 6

## Jumper 4X1
designator JP?
footprint JP4
pins: 1, 2, 3, 4

## Jumper 4x2
designator JP?
footprint JP4x2
pins: 1, 2, 3, 4, 5, 6, 7, 8

## Jumper 5x1
designator JP?
footprint JP5
pins: 1, 2, 3, 4, 5

## Jumper 5x2
designator JP?
footprint JP5X2
pins: 1, 2, 3, 4, 5, 6, 7, 8, 9, 10

## Jumper 6x1
designator JP?
footprint JP6
pins: 1, 2, 3, 4, 5, 6

## Jumper 6x2
designator *
footprint JP6X2
pins: 1, 2, 3, 4, 5, 6, 7, 8, 9, 10, 11, 12

## Jumper 7x1
designator JP?
footprint JP7
pins: 1, 2, 3, 4, 5, 6, 7

## Jumper 7x2
designator JP?
footprint JP7X2
pins: 1, 2, 3, 4, 5, 6, 7, 8, 9, 10, 11, 12, 13, 14

## Jumper 8x1
designator JP?
footprint JP8
pins: 1, 2, 3, 4, 5, 6, 7, 8

## Jumper 8x2
designator JP?
footprint JP8x2
pins: 1, 2, 3, 4, 5, 6, 7, 8, 9, 10, 11, 12, 13, 14, 15, 16

## Jumper 10X2
designator JP?, comment Jumper 10x2  (value not drawn)
footprint CONNECTOR 10x2
pins: 1, 2, 3, 4, 5, 6, 7, 8, 9, 10, 11, 12, 13, 14, 15, 16, 17, 18, 19, 20

## L297
designator IC?, comment Driver
footprint DIP20
footprint SO20
pins: 1 Sync, 2 0V, 3 Home, 4 A, 5 ~{INH}1, 6 B, 7 C, 8 ~{INH}2, 9 D, 10 Enable, 11 Ctrl, 12 5V, 13 Sense1, 14 Sense2, 15 Vdd, 16 Osc, 17 Cw/~{Ccw}, 18 ~{Clock}, 19 Half/~{Full}, 20 ~{Reset}

## L298
designator IC?
footprint Multiwatt15
footprint SO20
pins: 1 CSA, 2 OUTPUT2, 3 OUTPUT1, 4 50V, 5 INPUT1, 6 ENA, 7 INPUT2, 8 GND, 9 05V, 10 INPUT3, 11 ENB, 12 INPUT4, 13 OUTPUT3, 14 OUTPUT4, 15 CSB
